# Altium footprint library tsl_Pcblib.PcbLib: 219 footprints (part 12 of 14)
Each footprint in its own frame and in the unit in brackets; x right, y up, seen from the top. Pads: shape width x height; smd on the part's side, far side on the other; paste and mask are expansions set on the pad; w line width, h text height; cw(c..) or ccw(c..) is an arc to the next point about the centre after c.
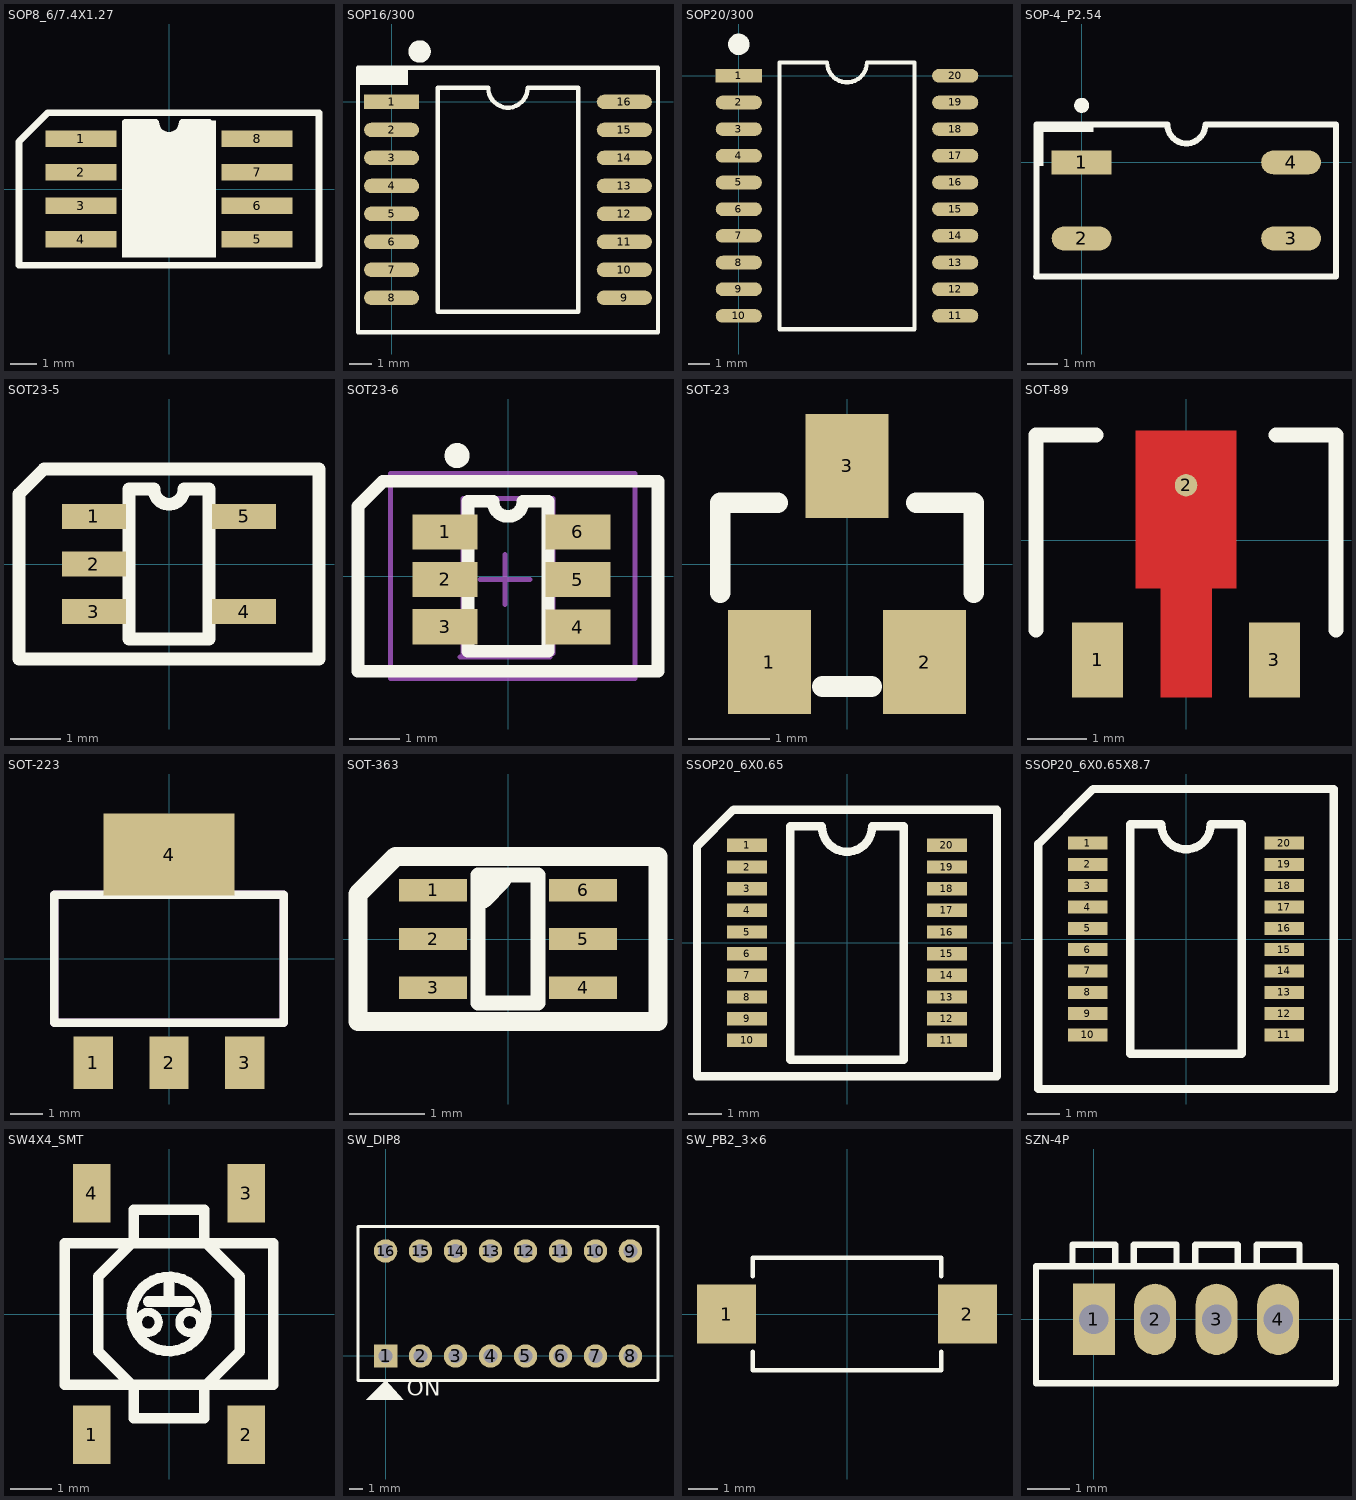
[diagram p11: the footprints below, top view; thin cyan lines are the x and y axes]

## SOP8_6/7.4X1.27 [mm]
pads (8):
  rect 2.7x0.635 smd: 1(-3.35,1.905) 2(-3.35,0.635) 3(-3.35,-0.635) 4(-3.35,-1.905) 5(3.35,-1.905) 6(3.35,-0.635) 7(3.35,0.635) 8(3.35,1.905)
Top Overlay:
  region: -1.778,2.6 -1.778,-2.6 1.778,-2.6 1.778,2.6 0.51,2.6 0.471,2.405 0.36,2.24 0.195,2.129 0,2.09 -0.195,2.129 -0.36,2.24 -0.471,2.405 -0.51,2.6
  lines w0.254: -1.651,2.54 -0.5,2.54 ccw(c0,2.54) 0.5,2.54 1.524,2.54 ; -5.7,-2.9 5.7,-2.9 5.7,2.9 -4.6,2.9 -5.7,1.8 -5.7,-2.9

## SOP16/300 [mm]
pads (16):
  rect 2.5x0.65 smd: 1(0,0)
  oval 2.5x0.65 smd: 2(0,-1.27) 3(0,-2.54) 4(0,-3.81) 5(0,-5.08) 6(0,-6.35) 7(0,-7.62) 8(0,-8.89) 9(10.56,-8.89) 10(10.56,-7.62) 11(10.56,-6.35) 12(10.56,-5.08) 13(10.56,-3.81) 14(10.56,-2.54) 15(10.56,-1.27) 16(10.56,0)
Top Overlay:
  circle w0.508: c1.27,2.286 r0.254
  rectangle: -1.422,0.761 0.737,1.554
  lines w0.203: 5.867,1.555 12.09,1.555 12.09,-10.445 -1.524,-10.445 -1.524,1.555 6.172,1.555 ; 2.085,-9.525 2.085,0.635 4.386,0.635 ccw(c5.28,0.635) 6.174,0.635 8.475,0.635 8.475,-9.525 2.085,-9.525
3D body "User Library-SOIC16_Wide_JEDEC_MS-013AA.step": height 2.62, standoff -0.03, extent -0.108,-9.738 10.522,0.762

## SOP20/300 [mm]
pads (20):
  rect 2.2x0.65 smd: 1(0,0)
  oval 2.2x0.65 smd: 2(0,-1.27) 3(0,-2.54) 4(0,-3.81) 5(0,-5.08) 6(0,-6.35) 7(0,-7.62) 8(0,-8.89) 9(0,-10.16) 10(0,-11.43) 11(10.3,-11.43) 12(10.3,-10.16) 13(10.3,-8.89) 14(10.3,-7.62) 15(10.3,-6.35) 16(10.3,-5.08) 17(10.3,-3.81) 18(10.3,-2.54) 19(10.3,-1.27) 20(10.3,0)
Top Overlay:
  circle w0.508: c0,1.497 r0.254
  lines w0.2: 4.203,0.635 ccw(c5.15,0.635) 6.097,0.635
  lines w0.203: 4.203,0.635 1.935,0.635 1.935,-12.065 8.365,-12.065 8.365,0.635 6.097,0.635

## SOP-4_P2.54 [mm]
height 2.13
pads (4):
  rect 2x0.8 smd: 1(0,0)
  oval 2x0.8 smd: 2(0,-2.54) 3(7,-2.54) 4(7,0)
Top Overlay:
  circle w0.25: c0.002,1.905 r0.125
  rectangle: -1.523,-0.127 -1.27,1.27
  rectangle: -1.5,1.016 0.404,1.27
  lines w0.2: -1.524,-3.81 8.5,-3.81 8.5,1.27 4.135,1.27 cw(c3.5,1.27) 2.865,1.27 -1.5,1.27 -1.5,-3.81

## SOT23-5 [mm]
pads (5):
  rect 1.27x0.5 smd: 1(-1.5,0.95) 2(-1.5,0) 3(-1.5,-0.95) 4(1.5,-0.95) 5(1.5,0.95)
Top Overlay:
  lines w0.254: -3,-1.9 3,-1.9 3,1.9 -2.5,1.9 -3,1.4 -3,-1.9 ; -0.8,-1.5 0.8,-1.5 0.8,1.5 0.3,1.5 cw(c0,1.496) -0.3,1.5 -0.8,1.5 -0.8,-1.5
3D body "SOT-23-5.STEP": height 1.2, standoff 0, extent -1.4,-1.45 1.4,1.45

## SOT23-6 [mm] "SOT23, 5-Leads, Body 2.9x1.6mm, Pitch 0.95mm, Lead Span 2.8mm, IPC Low Density"
height 1.45
pads (6):
  rect 1.3x0.7 smd: 1(-1.257,0.889) 2(-1.257,-0.061) 3(-1.257,-1.011) 4(1.397,-1.016) 5(1.397,-0.066) 6(1.397,0.889)
Top Overlay:
  circle w0.25: c-1.018,2.413 r0.125
  lines w0.254: -3,-1.9 -3,1.4 -2.5,1.9 3,1.9 3,-1.9 -3,-1.9 ; -0.8,-1.5 -0.8,1.5 -0.3,1.5 ccw(c0,1.496) 0.3,1.5 0.8,1.5 0.8,-1.5 -0.8,-1.5
Mechanical 13:
  lines w0.1: -0.957,-1.611 0.843,-1.611 ; -0.9,-1.55 -0.9,1.55 0.9,1.55 0.9,-1.55
Mechanical 15:
  lines w0.1: -0.557,-0.061 0.443,-0.061 ; -0.057,-0.561 -0.057,0.439 ; -2.35,-2.05 2.54,-2.05 2.54,2.05 -2.35,2.05 -2.35,-2.05
3D body "SOT-23-5.STEP": height 1.2, standoff 0, extent -1.4,-1.45 1.4,1.45

## SOT-23 [mm]
pads (3):
  rect 1.016x1.27 smd: 1(-0.95,-1.2) 2(0.95,-1.2) 3(0,1.2)
Top Overlay:
  lines w0.254: -1.55,-0.35 -1.55,0.75 -0.85,0.75 ; -0.3,-1.5 0.3,-1.5 ; 0.85,0.75 1.55,0.75 1.55,-0.35
3D body "SOT-23-3.STEP": height 1.2, standoff 0, extent -1.45,-1.527 1.45,1.273

## SOT-89 [mil]
pads (3):
  rect 34x50 smd: 1(-59,-80) 3(59,-80)
  round 15 smd: 2(0,36.5)
Top Layer:
  region: -17,-105 -17,-32 -33.5,-32 -33.5,73 33.5,73 33.5,-32 17,-32 17,-105
Top Overlay:
  lines w10: -100,-60 -100,70 -60,70 ; 60,70 100,70 100,-60
3D body "SOT-89.STEP": height 59.45, standoff 0, extent -88.58,-97.98 88.59,71.31

## SOT-223 [mm]
pads (4):
  rect 1.2x1.6 smd: 1(-2.311,-3.175) 2(0,-3.175) 3(2.311,-3.175)
  rect 4x2.5 smd: 4(0,3.175)
Top Overlay:
  lines w0.254: -3.5,-1.95 -3.5,1.95 3.5,1.95 3.5,-1.95 -3.5,-1.95
Mechanical 13:
  lines w0.254: -3.5,-1.95 -3.5,1.95 3.5,1.95 3.5,-1.95 -3.5,-1.95
3D body "SOT-223_MP04A.STEP": height 1.7, standoff 0, extent -3.25,-3.099 3.25,3.861

## SOT-363 [mm]
pads (6):
  rect 0.9x0.3 smd: 1(-1,0.65) 2(-1,0) 3(-1,-0.65) 4(1,-0.65) 5(1,0) 6(1,0.65)
Top Overlay:
  lines w0.2: -0.4,-0.85 -0.4,0.85 0.4,0.85 0.4,-0.85 -0.4,-0.85
  lines w0.254: -2,-1.1 -2,0.6 -1.5,1.1 2,1.1 2,-1.1 -2,-1.1
  lines w0.3: -0.35,0.55 -0.1,0.8

## SSOP20_6X0.65 [mm]
pads (20):
  rect 1.2x0.4 smd: 1(-3,2.925) 2(-3,2.275) 3(-3,1.625) 4(-3,0.975) 5(-3,0.325) 6(-3,-0.325) 7(-3,-0.975) 8(-3,-1.625) 9(-3,-2.275) 10(-3,-2.925) 11(3,-2.925) 12(3,-2.275) 13(3,-1.625) 14(3,-0.975) 15(3,-0.325) 16(3,0.325) 17(3,0.975) 18(3,1.625) 19(3,2.275) 20(3,2.925)
Top Overlay:
  lines w0.254: -4.5,-4 -4.5,2.9 -3.4,4 4.5,4 4.5,-4 -4.5,-4 ; -1.7,-3.5 1.7,-3.5 1.7,3.5 0.75,3.5 cw(c0,3.484) -0.75,3.5 -1.7,3.5 -1.7,-3.5

## SSOP20_6X0.65X8.7 [mm]
pads (20):
  rect 1.2x0.4 smd: 1(-3,2.925) 2(-3,2.275) 3(-3,1.625) 4(-3,0.975) 5(-3,0.325) 6(-3,-0.325) 7(-3,-0.975) 8(-3,-1.625) 9(-3,-2.275) 10(-3,-2.925) 11(3,-2.925) 12(3,-2.275) 13(3,-1.625) 14(3,-0.975) 15(3,-0.325) 16(3,0.325) 17(3,0.975) 18(3,1.625) 19(3,2.275) 20(3,2.925)
Top Overlay:
  lines w0.254: -4.5,-4.572 -4.5,2.9 -2.828,4.572 4.5,4.572 4.5,-4.572 -4.5,-4.572 ; -1.7,-3.5 1.7,-3.5 1.7,3.5 0.75,3.5 cw(c0,3.484) -0.75,3.5 -1.7,3.5 -1.7,-3.5

## SW4X4_SMT [mm]
pads (4):
  rect 0.9x1.4 smd: 1(-1.85,-2.9) 2(1.85,-2.9) 3(1.85,2.9) 4(-1.85,2.9)
Top Overlay:
  circle w0.2: c0.5,-0.2 r0.25
  circle w0.2: c-0.5,-0.2 r0.25
  circle w0.254: c0,0 r0.892
  lines w0.254: -0.5,0.3 0.5,0.3 ; 0,0.4 0,0.7 ; -2.5,-1.7 -2.5,1.7 2.5,1.7 2.5,-1.7 -2.5,-1.7 ; -1.7,-0.9 -1.7,0.9 -0.9,1.7 0.9,1.7 1.7,0.9 1.7,-0.9 0.9,-1.7 -0.9,-1.7 -1.7,-0.9 ; -0.85,-2.5 0.85,-2.5 0.85,-1.7 -0.85,-1.7 -0.85,-2.5 ; -0.85,1.7 0.85,1.7 0.85,2.5 -0.85,2.5 -0.85,1.7
3D body "Button Tactile Switch, SPST-NO 0.05 A@ 12 V dc 0.3.stp": height 1.5, standoff 0, extent -2.6,-3.2 2.6,3.2

## SW_DIP8 [mm]
pads (16):
  rect 1.7x1.7 hole 1: 1(0,0)
  round 1.7 hole 1: 2(2.54,0) 3(5.08,0) 4(7.62,0) 5(10.16,0) 6(12.7,0) 7(15.24,0) 8(17.78,0) 9(17.78,7.62) 10(15.24,7.62) 11(12.7,7.62) 12(10.16,7.62) 13(7.62,7.62) 14(5.08,7.62) 15(2.54,7.62) 16(0,7.62)
Top Overlay:
  region: 0,-1.778 -1.397,-3.175 1.27,-3.175
  lines w0.203: -2,-1.778 19.78,-1.778 19.78,9.398 -2,9.398 -2,-1.778
  text "ON" at 1.524,-3.302 h2
3D body "19649.stp": height 10.2, standoff -3.2, extent -2.024,-3.339 19.856,9.261

## SW_PB2_3×6 [mm] "SW_PB2"
pads (2):
  rect 2x2 smd: 1(-4.064,0) 2(4.064,0)
Top Overlay:
  lines w0.152: -3.175,-1.27 -3.175,-1.905 3.175,-1.905 3.175,-1.27 ; -3.175,1.27 -3.175,1.905 3.175,1.905 3.175,1.27

## SZN-4P [mm]
pads (4):
  rect 1x1.7 hole 0.7: 1(0,0)
  oval 1x1.7 hole 0.7: 2(1.465,0) 3(2.93,0) 4(4.4,0)
Top Overlay:
  lines w0.152: -0.508,1.27 -0.508,1.778 0.508,1.778 0.508,1.27 ; 0.957,1.27 0.957,1.778 1.973,1.778 1.973,1.27 ; 2.422,1.27 2.422,1.778 3.438,1.778 3.438,1.27 ; 3.892,1.27 3.892,1.778 4.908,1.778 4.908,1.27 ; -1.379,-1.524 5.779,-1.524 5.779,1.27 -1.379,1.27 -1.379,-1.524